# Altium footprint library cool_library.PcbLib: 1182 footprints (part 66 of 75)
Each footprint in its own frame and in the unit in brackets; x right, y up, seen from the top. Pads: shape width x height; smd on the part's side, far side on the other; paste and mask are expansions set on the pad; w line width, h text height; cw(c..) or ccw(c..) is an arc to the next point about the centre after c.
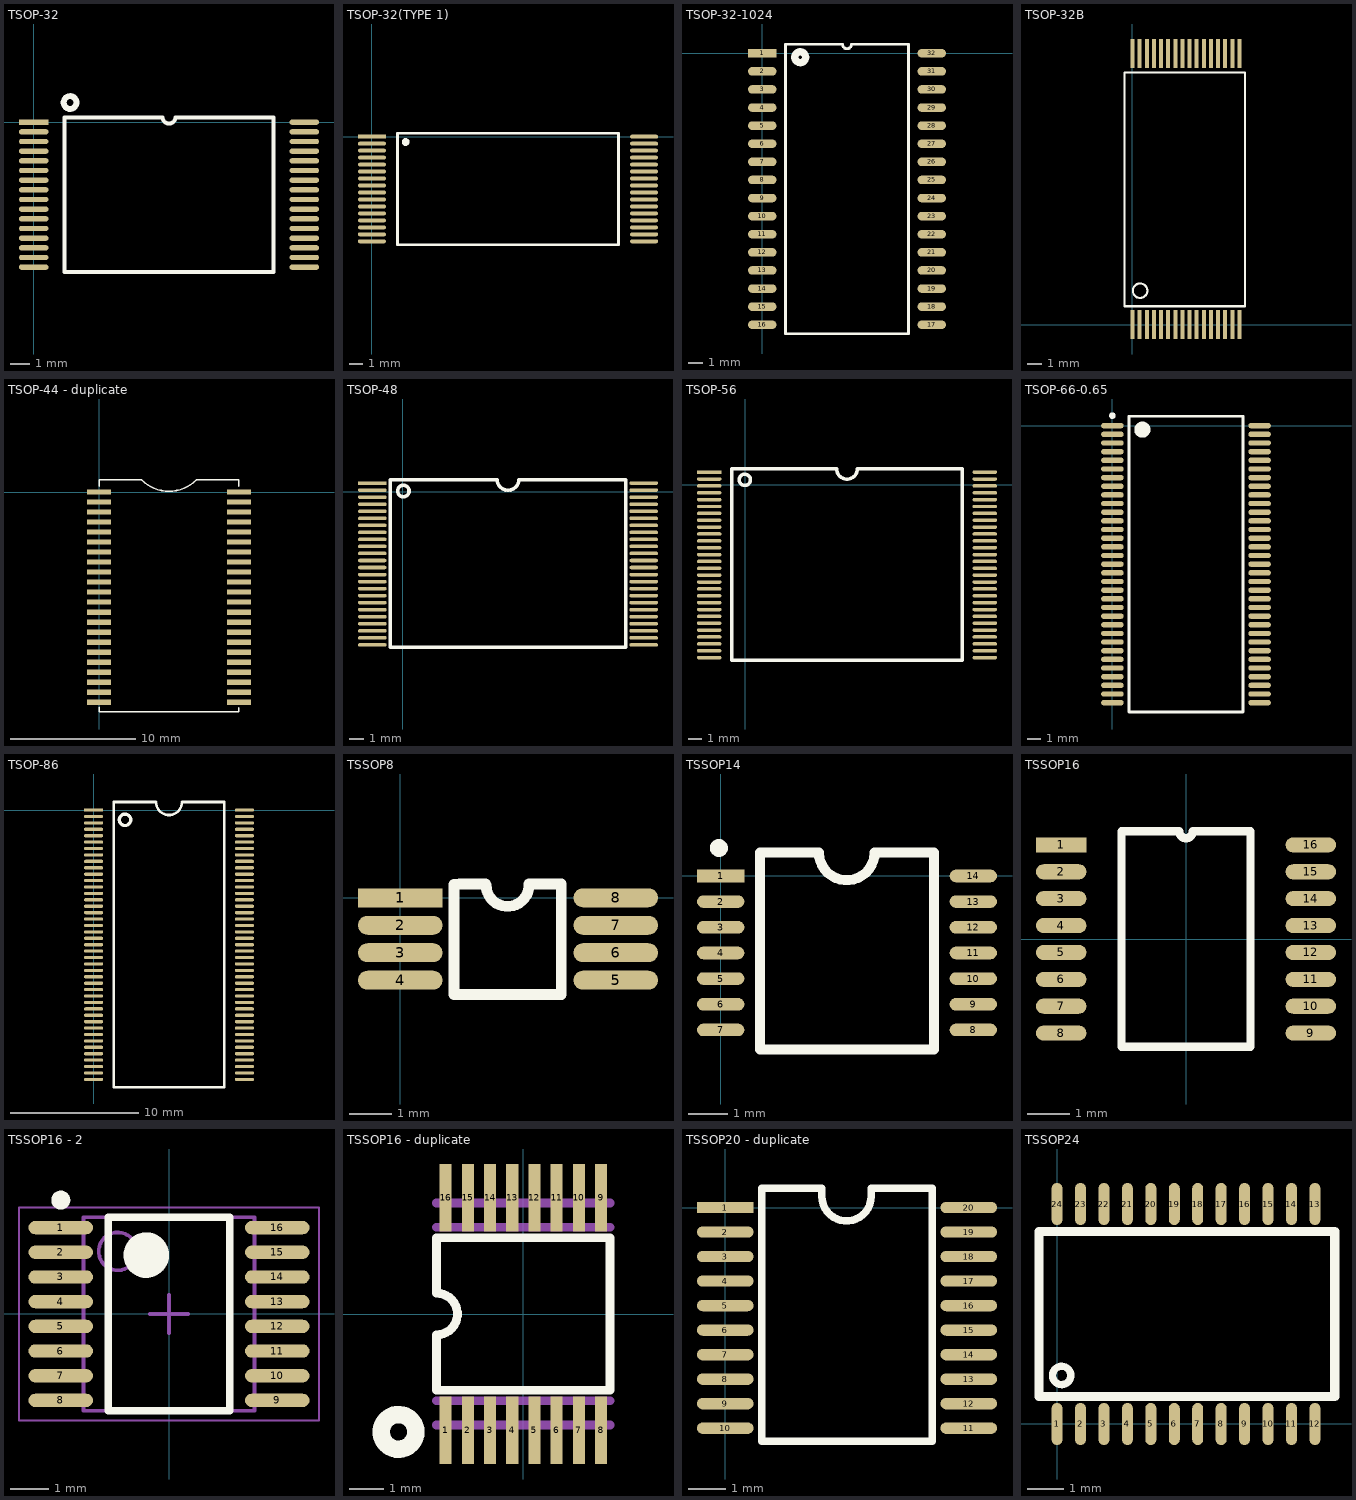
[diagram p65: the footprints below, top view; thin cyan lines are the x and y axes]

## TSOP-32 [mil]
pads (32):
  rect 60x11 smd: 1(0,0)
  oval 60x11 smd: 2(0,-19.68) 3(0,-39.37) 4(0,-59.05) 5(0,-78.74) 6(0,-98.42) 7(0,-118.11) 8(0,-137.79) 9(0,-157.48) 10(0,-177.16) 11(0,-196.85) 12(0,-216.53) 13(0,-236.22) 14(0,-255.91) 15(0,-275.59) 16(0,-295.27) 17(551.18,-295.27) 18(551.18,-275.59) 19(551.18,-255.91) 20(551.18,-236.22) 21(551.18,-216.53) 22(551.18,-196.85) 23(551.18,-177.16) 24(551.18,-157.48) 25(551.18,-137.79) 26(551.18,-118.11) 27(551.18,-98.42) 28(551.18,-78.74) 29(551.18,-59.05) 30(551.18,-39.37) 31(551.18,-19.68) 32(551.18,0)
Top Overlay:
  circle w12: c74,40 r13
  lines w7.87: 62.4,-305.12 62.4,9.84 262.73,9.84 ccw(c275.59,9.84) 288.45,9.84 488.78,9.84 488.78,-305.12 62.4,-305.12

## TSOP-32(TYPE 1) [mm]
pads (32):
  rect 2x0.28 smd: 1(0,0)
  oval 2x0.28 smd: 2(0,-0.5) 3(0,-1) 4(0,-1.5) 5(0,-2) 6(0,-2.5) 7(0,-3) 8(0,-3.5) 9(0,-4) 10(0,-4.5) 11(0,-5) 12(0,-5.5) 13(0,-6) 14(0,-6.5) 15(0,-7) 16(0,-7.5) 17(19.5,-7.5) 18(19.5,-7) 19(19.5,-6.5) 20(19.5,-6) 21(19.5,-5.5) 22(19.5,-5) 23(19.5,-4.5) 24(19.5,-4) 25(19.5,-3.5) 26(19.5,-3) 27(19.5,-2.5) 28(19.5,-2) 29(19.5,-1.5) 30(19.5,-1) 31(19.5,-0.5) 32(19.5,0)
Top Overlay:
  circle w0.3: c2.415,-0.381 r0.125
  lines w0.2: 1.835,-7.75 1.835,0.25 17.665,0.25 17.665,-7.75 1.835,-7.75

## TSOP-32-1024 [mm]
pads (32):
  rect 2x0.6 smd: 1(0,0)
  oval 2x0.6 smd: 2(0,-1.27) 3(0,-2.54) 4(0,-3.81) 5(0,-5.08) 6(0,-6.35) 7(0,-7.62) 8(0,-8.89) 9(0,-10.16) 10(0,-11.43) 11(0,-12.7) 12(0,-13.97) 13(0,-15.24) 14(0,-16.51) 15(0,-17.78) 16(0,-19.05) 17(11.9,-19.05) 18(11.9,-17.78) 19(11.9,-16.51) 20(11.9,-15.24) 21(11.9,-13.97) 22(11.9,-12.7) 23(11.9,-11.43) 24(11.9,-10.16) 25(11.9,-8.89) 26(11.9,-7.62) 27(11.9,-6.35) 28(11.9,-5.08) 29(11.9,-3.81) 30(11.9,-2.54) 31(11.9,-1.27) 32(11.9,0)
Top Overlay:
  circle w0.508: c2.667,-0.279 r0.381
  lines w0.2: 1.635,-19.685 1.635,0.635 5.632,0.635 ccw(c5.95,0.635) 6.267,0.635 10.265,0.635 10.265,-19.685 1.635,-19.685

## TSOP-32B [mm]
pads (32):
  rect 0.28x2.032 smd: 1(0,0) 2(0.5,0) 3(1,0) 4(1.5,0) 5(2,0) 6(2.5,0) 7(3,0) 8(3.5,0) 9(4,0) 10(4.5,0) 11(5,0) 12(5.5,0) 13(6,0) 14(6.5,0) 15(7,0) 16(7.5,0) 17(7.5,18.994) 18(7,18.994) 19(6.5,18.994) 20(6,18.994) 21(5.5,18.994) 22(5,18.994) 23(4.5,18.994) 24(4,18.994) 25(3.5,18.994) 26(3,18.994) 27(2.5,18.994) 28(2,18.994) 29(1.5,18.994) 30(1,18.994) 31(0.5,18.994) 32(0,18.994)
Top Overlay:
  circle w0.152: c0.533,2.368 r0.508
  lines w0.152: -0.566,1.276 7.895,1.276 7.895,17.659 -0.566,17.659 -0.566,1.276

## TSOP-44 - duplicate [mil]
pads (44):
  rect 75x17 smd: 1(0,0) 2(0,-31.5) 3(0,-63) 4(0,-94.5) 5(0,-126) 6(0,-157.5) 7(0,-189) 8(0,-220.5) 9(0,-252) 10(0,-283.5) 11(0,-315) 12(0,-346.5) 13(0,-378) 14(0,-409.5) 15(0,-441) 16(0,-472.5) 17(0,-504) 18(0,-535.5) 19(0,-567) 20(0,-598.5) 21(0,-630) 22(0,-661.5) 23(440,-661.5) 24(440,-630) 25(440,-598.5) 26(440,-567) 27(440,-535.5) 28(440,-504) 29(440,-472.5) 30(440,-441) 31(440,-409.5) 32(440,-378) 33(440,-346.5) 34(440,-315) 35(440,-283.5) 36(440,-252) 37(440,-220.5) 38(440,-189) 39(440,-157.5) 40(440,-126) 41(440,-94.5) 42(440,-63) 43(440,-31.5) 44(440,0)
Top Overlay:
  lines w5: 0,-678 0,-692 440,-692 440,-680 ; 0,18 0,38 134,38 ccw(c220,124) 306,38 440,38 440,18

## TSOP-48 [mil]
pads (48):
  rect 80x10 smd: 1(-85,24)
  oval 80x10 smd: 2(-85,4.32) 3(-85,-15.37) 4(-85,-35.05) 5(-85,-54.74) 6(-85,-74.42) 7(-85,-94.11) 8(-85,-113.8) 9(-85,-133.48) 10(-85,-153.16) 11(-85,-172.85) 12(-85,-192.53) 13(-85,-212.22) 14(-85,-231.91) 15(-85,-251.59) 16(-85,-271.27) 17(-85,-290.96) 18(-85,-310.64) 19(-85,-330.33) 20(-85,-350.01) 21(-85,-369.7) 22(-85,-389.38) 23(-85,-409.07) 24(-85,-428.75) 25(675,-428.75) 26(675,-409.07) 27(675,-389.38) 28(675,-369.7) 29(675,-350.01) 30(675,-330.33) 31(675,-310.64) 32(675,-290.96) 33(675,-271.27) 34(675,-251.59) 35(675,-231.91) 36(675,-212.22) 37(675,-192.53) 38(675,-172.85) 39(675,-153.16) 40(675,-133.48) 41(675,-113.8) 42(675,-94.11) 43(675,-74.42) 44(675,-54.74) 45(675,-35.05) 46(675,-15.37) 47(675,4.32) 48(675,24)
Top Overlay:
  circle w10: c1.88,2 r16.12
  lines w10: -35,-436 625,-436 625,34 324.99,34 cw(c294.99,34) 264.99,34 -35,34 -35,-436

## TSOP-56 [mil]
pads (56):
  rect 70x10 smd: 1(-104,36)
  oval 70x10 smd: 2(-104,16.32) 3(-104,-3.37) 4(-104,-23.05) 5(-104,-42.74) 6(-104,-62.42) 7(-104,-82.11) 8(-104,-101.8) 9(-104,-121.48) 10(-104,-141.16) 11(-104,-160.85) 12(-104,-180.53) 13(-104,-200.22) 14(-104,-219.91) 15(-104,-239.59) 16(-104,-259.27) 17(-104,-278.96) 18(-104,-298.64) 19(-104,-318.33) 20(-104,-338.01) 21(-104,-357.7) 22(-104,-377.38) 23(-104,-397.07) 24(-104,-416.75) 25(-104,-436.44) 26(-104,-456.12) 27(-104,-475.81) 28(-104,-495.49) 29(686,-495.49) 30(686,-475.81) 31(686,-456.12) 32(686,-436.44) 33(686,-416.76) 34(686,-397.07) 35(686,-377.38) 36(686,-357.7) 37(686,-338.01) 38(686,-318.33) 39(686,-298.64) 40(686,-278.96) 41(686,-259.27) 42(686,-239.59) 43(686,-219.91) 44(686,-200.22) 45(686,-180.53) 46(686,-160.85) 47(686,-141.16) 48(686,-121.48) 49(686,-101.79) 50(686,-82.11) 51(686,-62.42) 52(686,-42.74) 53(686,-23.06) 54(686,-3.37) 55(686,16.32) 56(686,36)
Top Overlay:
  circle w10: c-2.12,14 r16.12
  lines w10: -39,-502.74 621,-502.74 621,46 320.99,46 cw(c290.99,46) 260.99,46 -39,46 -39,-502.74

## TSOP-66-0.65 [mm] "TSOP, 66-Leads, Body 22.2x10.2mm (max), Pitch 0.65mm, IPC Medium Density"
height 1.2
pads (66):
  oval 1.7x0.4 smd: 1(0,0) 2(0,-0.65) 3(0,-1.3) 4(0,-1.95) 5(0,-2.6) 6(0,-3.25) 7(0,-3.9) 8(0,-4.55) 9(0,-5.2) 10(0,-5.85) 11(0,-6.5) 12(0,-7.15) 13(0,-7.8) 14(0,-8.45) 15(0,-9.1) 16(0,-9.75) 17(0,-10.4) 18(0,-11.05) 19(0,-11.7) 20(0,-12.35) 21(0,-13) 22(0,-13.65) 23(0,-14.3) 24(0,-14.95) 25(0,-15.6) 26(0,-16.25) 27(0,-16.9) 28(0,-17.55) 29(0,-18.2) 30(0,-18.85) 31(0,-19.5) 32(0,-20.15) 33(0,-20.8) 34(11.05,-20.8) 35(11.05,-20.15) 36(11.05,-19.5) 37(11.05,-18.85) 38(11.05,-18.2) 39(11.05,-17.55) 40(11.05,-16.9) 41(11.05,-16.25) 42(11.05,-15.6) 43(11.05,-14.95) 44(11.05,-14.3) 45(11.05,-13.65) 46(11.05,-13) 47(11.05,-12.35) 48(11.05,-11.7) 49(11.05,-11.05) 50(11.05,-10.4) 51(11.05,-9.75) 52(11.05,-9.1) 53(11.05,-8.45) 54(11.05,-7.8) 55(11.05,-7.15) 56(11.05,-6.5) 57(11.05,-5.85) 58(11.05,-5.2) 59(11.05,-4.55) 60(11.05,-3.9) 61(11.05,-3.25) 62(11.05,-2.6) 63(11.05,-1.95) 64(11.05,-1.3) 65(11.05,-0.65) 66(11.05,0)
Top Overlay:
  circle w0.6: c2.25,-0.3 r0.3
  circle w0.25: c0,0.75 r0.125
  lines w0.2: 1.25,-21.5 9.8,-21.5 9.8,0.7 1.25,0.7 1.25,-21.5

## TSOP-86 [mm]
height 1.27
pads (86):
  rect 1.5x0.25 smd: 1(0,0)
  oval 1.5x0.25 smd: 2(0,-0.5) 3(0,-1) 4(0,-1.5) 5(0,-2) 6(0,-2.5) 7(0,-3) 8(0,-3.5) 9(0,-4) 10(0,-4.5) 11(0,-5) 12(0,-5.5) 13(0,-6) 14(0,-6.5) 15(0,-7) 16(0,-7.5) 17(0,-8) 18(0,-8.5) 19(0,-9) 20(0,-9.5) 21(0,-10) 22(0,-10.5) 23(0,-11) 24(0,-11.5) 25(0,-12) 26(0,-12.5) 27(0,-13) 28(0,-13.5) 29(0,-14) 30(0,-14.5) 31(0,-15) 32(0,-15.5) 33(0,-16) 34(0,-16.5) 35(0,-17) 36(0,-17.5) 37(0,-18) 38(0,-18.5) 39(0,-19) 40(0,-19.5) 41(0,-20) 42(0,-20.5) 43(0,-21) 44(11.76,-21) 45(11.76,-20.5) 46(11.76,-20) 47(11.76,-19.5) 48(11.76,-19) 49(11.76,-18.5) 50(11.76,-18) 51(11.76,-17.5) 52(11.76,-17) 53(11.76,-16.5) 54(11.76,-16) 55(11.76,-15.5) 56(11.76,-15) 57(11.76,-14.5) 58(11.76,-14) 59(11.76,-13.5) 60(11.76,-13) 61(11.76,-12.5) 62(11.76,-12) 63(11.76,-11.5) 64(11.76,-11) 65(11.76,-10.5) 66(11.76,-10) 67(11.76,-9.5) 68(11.76,-9) 69(11.76,-8.5) 70(11.76,-8) 71(11.76,-7.5) 72(11.76,-7) 73(11.76,-6.5) 74(11.76,-6) 75(11.76,-5.5) 76(11.76,-5) 77(11.76,-4.5) 78(11.76,-4) 79(11.76,-3.5) 80(11.76,-3) 81(11.76,-2.5) 82(11.76,-2) 83(11.76,-1.5) 84(11.76,-1) 85(11.76,-0.5) 86(11.76,0)
Top Overlay:
  circle w0.254: c2.451,-0.762 r0.444
  lines w0.2: 4.841,0.625 1.562,0.625 1.562,-21.625 10.198,-21.625 10.198,0.625 ; 4.864,0.625 ccw(c5.88,0.625) 6.896,0.625 10.175,0.625

## TSSOP8 [mm]
pads (8):
  rect 2x0.45 smd: 1(0,0)
  oval 2x0.45 smd: 2(0,-0.65) 3(0,-1.3) 4(0,-1.95) 5(5.1,-1.95) 6(5.1,-1.3) 7(5.1,-0.65) 8(5.1,0)
Top Overlay:
  lines w0.254: 2.016,0.325 1.408,0.325 1.27,0.314 1.27,-2.286 3.81,-2.286 3.81,0.325 3.048,0.325 ; 2.032,0.305 ccw(c2.54,0.305) 3.048,0.305

## TSSOP14 [mm]
pads (14):
  rect 1.2x0.32 smd: 1(0,0)
  oval 1.2x0.32 smd: 2(0,-0.65) 3(0,-1.3) 4(0,-1.95) 5(0,-2.6) 6(0,-3.25) 7(0,-3.9) 8(6.4,-3.9) 9(6.4,-3.25) 10(6.4,-2.6) 11(6.4,-1.95) 12(6.4,-1.3) 13(6.4,-0.65) 14(6.4,0)
Top Overlay:
  lines w0.254: 0,0.8 ccw(c-0.045,0.711) 0.026,0.781 ; 1,-4.4 5.4,-4.4 5.4,0.6 3.9,0.6 cw(c3.194,0.6) 2.487,0.6 1,0.6 1,-4.4
3D body: height 1.2, standoff 0, extent 0.026,-4.506 6.426,0.594

## TSSOP16 [mm]
pads (16):
  rect 1.2x0.36 smd: 1(-2.97,2.24)
  oval 1.2x0.36 smd: 2(-2.97,1.6) 3(-2.97,0.96) 4(-2.97,0.32) 5(-2.97,-0.32) 6(-2.97,-0.96) 7(-2.97,-1.6) 8(-2.97,-2.24) 9(2.97,-2.24) 10(2.97,-1.6) 11(2.97,-0.96) 12(2.97,-0.32) 13(2.97,0.32) 14(2.97,0.96) 15(2.97,1.6) 16(2.97,2.24)
Top Overlay:
  lines w0.2: -1.535,-2.56 1.535,-2.56 1.535,2.56 0.16,2.56 cw(c0,2.56) -0.16,2.56 -1.535,2.56 -1.535,-2.56

## TSSOP16 - 2 [mm] "TSOP, 16-Leads, Body 5.00x4.40mm, Pitch 0.65mm, IPC Medium Density"
height 1.2
pads (16):
  oval 1.7x0.35 smd: 1(-2.85,2.275) 2(-2.85,1.625) 3(-2.85,0.975) 4(-2.85,0.325) 5(-2.85,-0.325) 6(-2.85,-0.975) 7(-2.85,-1.625) 8(-2.85,-2.275) 9(2.85,-2.275) 10(2.85,-1.625) 11(2.85,-0.975) 12(2.85,-0.325) 13(2.85,0.325) 14(2.85,0.975) 15(2.85,1.625) 16(2.85,2.275)
Top Overlay:
  circle w0.6: c-0.6,1.55 r0.3
  circle w0.25: c-2.85,3 r0.125
  lines w0.2: -1.6,-2.55 1.6,-2.55 1.6,2.55 -1.6,2.55 -1.6,-2.55
Mechanical 13:
  circle w0.1: c-1.35,1.65 r0.5
  lines w0.1: -2.25,-2.55 2.25,-2.55 2.25,2.55 -2.25,2.55 -2.25,-2.55
Mechanical 15:
  lines w0.05: -3.95,-2.8 3.95,-2.8 3.95,2.8 -3.95,2.8 -3.95,-2.8
  lines w0.1: -0.5,0 0.5,0 ; 0,-0.5 0,0.5
3D body: height 1.09, standoff 0, extent -3.115,-2.515 3.165,2.485

## TSSOP16 - duplicate [mm]
pads (16):
  rect 0.35x1.95 smd: 1(-2.24,-3.35) 2(-1.6,-3.35) 3(-0.96,-3.35) 4(-0.32,-3.35) 5(0.32,-3.35) 6(0.96,-3.35) 7(1.6,-3.35) 8(2.24,-3.35) 9(2.24,3.35) 10(1.6,3.35) 11(0.96,3.35) 12(0.32,3.35) 13(-0.32,3.35) 14(-0.96,3.35) 15(-1.6,3.35) 16(-2.24,3.35)
Top Overlay:
  circle w0.5: c-3.6,-3.4 r0.5
  lines w0.254: -2.5,-2.2 2.5,-2.2 2.5,2.2 -2.5,2.2 -2.5,0.6 cw(c-2.5,0) -2.5,-0.6 -2.5,-2.2
Mechanical 2:
  lines w0.254: -2.5,-3.2 2.5,-3.2 ; -2.5,-2.5 2.5,-2.5 ; -2.5,2.5 2.5,2.5 ; -2.5,3.2 2.5,3.2

## TSSOP20 - duplicate [mm]
pads (20):
  rect 1.5x0.3 smd: 1(0,0)
  oval 1.5x0.3 smd: 2(0,-0.65) 3(0,-1.3) 4(0,-1.95) 5(0,-2.6) 6(0,-3.25) 7(0,-3.9) 8(0,-4.55) 9(0,-5.2) 10(0,-5.85) 11(6.454,-5.85) 12(6.454,-5.2) 13(6.454,-4.55) 14(6.454,-3.9) 15(6.454,-3.25) 16(6.454,-2.6) 17(6.454,-1.95) 18(6.454,-1.3) 19(6.454,-0.65) 20(6.454,0)
Top Overlay:
  lines w0.2: 0.965,-6.2 5.486,-6.2 5.486,0.508 3.87,0.508 3.87,0.3 cw(c3.214,0.3) 2.559,0.3 2.559,0.508 0.965,0.508 0.965,-6.2
3D body: height 1.2, standoff 0, extent -0.049,-6.221 6.501,0.379

## TSSOP24 [mil]
pads (24):
  oval 12x46 smd: 1(0,0) 2(25.59,0) 3(51.18,0) 4(76.77,0) 5(102.36,0) 6(127.95,0) 7(153.54,0) 8(179.13,0) 9(204.72,0) 10(230.31,0) 11(255.91,0) 12(281.5,0) 13(281.5,240.16) 14(255.91,240.16) 15(230.31,240.16) 16(204.72,240.16) 17(179.13,240.16) 18(153.54,240.16) 19(127.95,240.16) 20(102.36,240.16) 21(76.77,240.16) 22(51.18,240.16) 23(25.59,240.16) 24(0,240.16)
Top Overlay:
  circle w8: c5,53 r10
  lines w10: -19.68,30 -19.68,210 303.15,210 303.15,30 -19.68,30